# Altium footprint library IntLib.PcbLib: 221 footprints (part 2 of 14)
Each footprint in its own frame and in the unit in brackets; x right, y up, seen from the top. Pads: shape width x height; smd on the part's side, far side on the other; paste and mask are expansions set on the pad; w line width, h text height; cw(c..) or ccw(c..) is an arc to the next point about the centre after c.
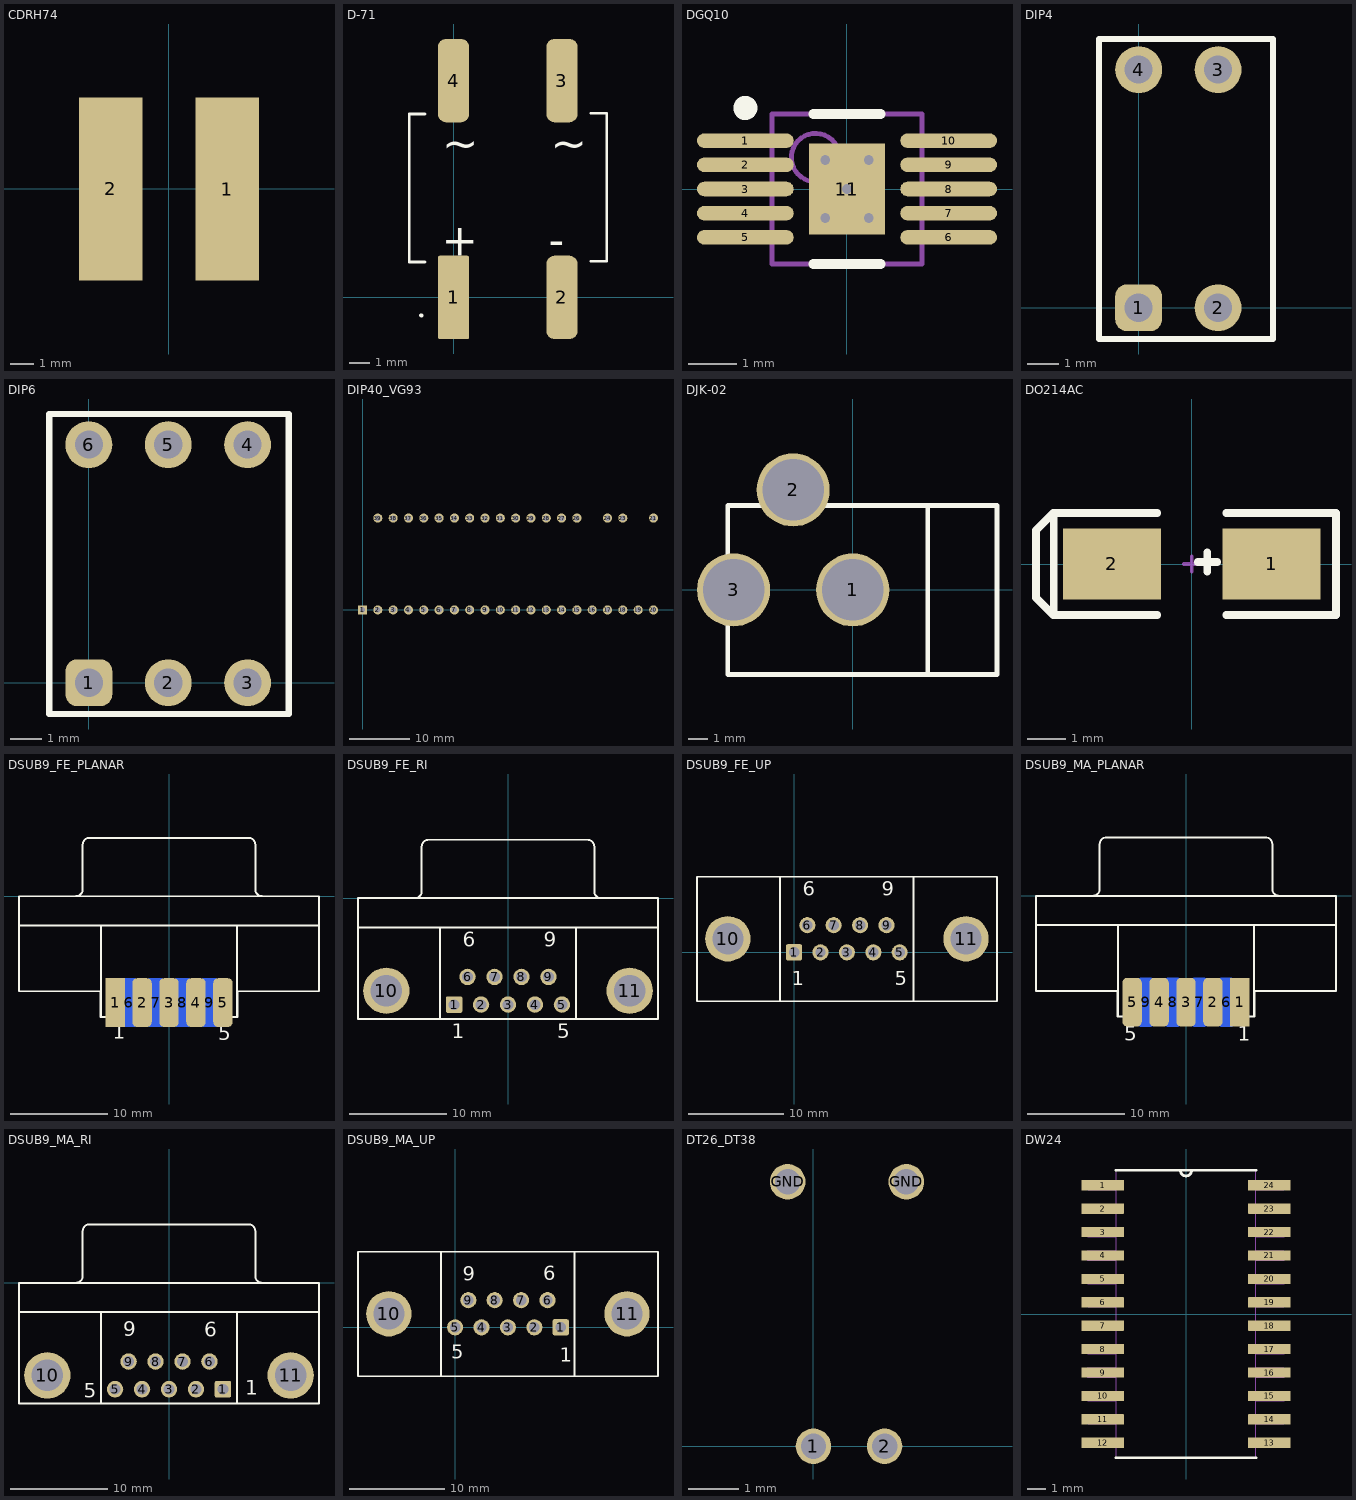
[diagram p1: the footprints below, top view; thin cyan lines are the x and y axes]

## CDRH74 [mm] "CDRH74 or SCB0704"
height 5
pads (2):
  rect 2.75x8 smd: 1(2.54,0) 2(-2.54,0)
3D body: height 4.5, standoff 0, extent -3.632,-3.556 3.668,3.744

## D-71 [mm] "D-71 / DB-1S Diode Bridge"
height 5
pads (4):
  rrect10% 1.5x4 smd: 1(0,0)
  rrect50% 1.5x4 smd: 2(5.207,0) 3(5.207,10.414) 4(0,10.414)
Top Overlay:
  circle w0.1: c-1.549,-0.864 r0.05
  lines w0.127: -1.372,1.702 -2.134,1.702 -2.134,8.814 -1.372,8.814 ; 6.604,1.727 7.366,1.727 7.366,8.839 6.604,8.839
  text "~" at -0.533,6.655 h1.52
  text "~" at 4.674,6.655 h1.52
  text "-" at 4.572,2.032 h1.52
  text "+" at -0.559,2.007 h1.52
3D body: height 3.65, standoff 0.08, extent -1.652,0.133 6.858,10.433

## DGQ10 [mm] "TSSOP, 10-Leads, Body 3x3mm, Pitch 0.5mm, Thermal Pad 1.88x1.57mm, IPC Low Density"
height 1.1
pads (11):
  oval 2x0.3 smd: 1(-2.1,1) 2(-2.1,0.5) 3(-2.1,0) 4(-2.1,-0.5) 5(-2.1,-1) 6(2.1,-1) 7(2.1,-0.5) 8(2.1,0) 9(2.1,0.5) 10(2.1,1)
  rect 1.57x1.88 smd: 11(0,0)
via -0.45,0.6 diameter 0.5 hole 0.2
via -0.45,-0.6 diameter 0.5 hole 0.2
via 0.45,-0.6 diameter 0.5 hole 0.2
via 0.45,0.6 diameter 0.5 hole 0.2
via 0,0 diameter 0.5 hole 0.2
Top Overlay:
  circle w0.25: c-2.1,1.675 r0.125
  lines w0.2: -0.7,-1.55 0.7,-1.55 ; -0.7,1.55 0.7,1.55
Mechanical 13:
  circle w0.1: c-0.65,0.65 r0.5
  lines w0.1: -1.55,-1.55 -1.55,1.55 1.55,1.55 1.55,-1.55 -1.55,-1.55
Mechanical 15:
  lines w0.1: -0.5,0 0.5,0 ; 0,-0.5 0,0.5
3D body: height 1.1, standoff 0, extent -2.518,-1.549 2.518,1.551

## DIP4 [mm] "DIP-4"
pads (4):
  rrect50% 1.5x1.5 hole 0.9: 1(0,0)
  round 1.5 hole 0.9: 2(2.54,0) 3(2.54,7.62) 4(0,7.62)
Top Overlay:
  lines w0.2: -1.27,-1 -1.27,8.6 4.3,8.6 4.3,-1 -1.27,-1
3D body: height 4.31, standoff -3.28, extent -1.44,-0.3 4.1,7.7

## DIP6 [mm] "DIP-6"
pads (6):
  rrect50% 1.5x1.5 hole 0.9: 1(0,0)
  round 1.5 hole 0.9: 2(2.54,0) 3(5.08,0) 4(5.08,7.62) 5(2.54,7.62) 6(0,7.62)
Top Overlay:
  lines w0.2: -1.27,-1 -1.27,8.6 6.4,8.6 6.4,-1 -1.27,-1
3D body: height 5.3, standoff -2, extent -1,-0.135 6.12,7.735

## DIP40_VG93 [mm] "DIP; 40 Leads; Row Spacing 15.24 mm; Pitch 2.54 mm"
height 4.96
pads (37):
  rect 1.5x1.5 hole 0.9: 1(0,0)
  round 1.5 hole 0.9: 2(2.54,0) 3(5.08,0) 4(7.62,0) 5(10.16,0) 6(12.7,0) 7(15.24,0) 8(17.78,0) 9(20.32,0) 10(22.86,0) 11(25.4,0) 12(27.94,0) 13(30.48,0) 14(33.02,0) 15(35.56,0) 16(38.1,0) 17(40.64,0) 18(43.18,0) 19(45.72,0) 20(48.26,0) 21(48.26,15.24) 23(43.18,15.24) 24(40.64,15.24) 26(35.56,15.24) 27(33.02,15.24) 28(30.48,15.24) 29(27.94,15.24) 30(25.4,15.24) 31(22.86,15.24) 32(20.32,15.24) 33(17.78,15.24) 34(15.24,15.24) 35(12.7,15.24) 36(10.16,15.24) 37(7.62,15.24) 38(5.08,15.24) 39(2.54,15.24)

## DJK-02 [mm]
pads (3):
  round 3.8 hole 3.2: 1(0,0) 2(-3.1,5.2) 3(-6.2,0)
Top Overlay:
  lines w0.254: 3.9,-4.4 3.9,4.4 ; -6.5,-4.4 7.5,-4.4 7.5,4.4 -6.5,4.4 -6.5,-4.4
3D body: height 11.2, standoff -3.3, extent -6.971,-4.497 7.529,4.953

## DO214AC [mm] "DO-214-AC/SMA; 2 C-Bend Leads; Body 5.3 x 2.6 mm, inc. leads (LxW)"
height 2.34
pads (2):
  rect 2.55x1.85 smd: 1(2.075,0) 2(-2.075,0)
Top Overlay:
  lines w0.2: -3.591,-1.325 -3.591,1.325 ; -0.9,-1.325 -3.6,-1.325 -4.05,-0.875 -4.05,0.875 -3.6,1.325 -0.9,1.325 ; 0.152,0.051 0.66,0.051 ; 0.406,-0.203 0.406,0.305 ; 0.9,-1.325 3.75,-1.325 3.75,1.325 0.9,1.325
Mechanical 3:
  lines w0.1: -0.2,0 0.2,0 ; 0,-0.2 0,0.2
3D body: height 2.6, standoff 0.03, extent -2.718,-1.397 2.782,1.403

## DSUB9_FE_PLANAR [mm] "Connector; D Subminiature; 9 Position; Right Angle; Pitch 1.385 mm"
height 12.75
pads (9):
  rect 2x5 smd: 1(-5.54,-10.92)
  rrect50% 2x5 smd: 2(-2.77,-10.92) 3(0,-10.92) 4(2.77,-10.92) 5(5.54,-10.92)
  rrect50% 2x5 smd far side: 6(-4.155,-10.92) 7(-1.385,-10.92) 8(1.385,-10.92) 9(4.155,-10.92)
Top Overlay:
  lines w0.2: -15.4,-3 15.4,-3 ; -9.56,0.005 ccw(c-9.56,0.7) -8.865,0.7 -8.865,5.3 ; -8.86,5.305 cw(c-8.165,5.305) -8.165,6 8.165,6 cw(c8.165,5.305) 8.86,5.305 ; -7,-12.4 -7,-3 ; 7,-12.4 7,-3 ; 8.865,5.3 8.865,0.7 ccw(c9.56,0.7) 9.56,0.005 ; -15.4,-9.754 -15.4,0 15.4,0 15.4,-9.754 7.01,-9.754 7.01,-12.4 -7.01,-12.4 -7.01,-9.754 -15.4,-9.754
  text "1" at -5.791,-14.63 h1.5
  text "5" at 5.055,-14.783 h1.5
Bottom Overlay:
  text "9" at 4.445,-14.757 h1.5
  text "6" at -3.556,-14.681 h1.5
3D body: height 5.77, standoff -6.77, extent -15.43,-9.754 15.38,5.896

## DSUB9_FE_RI [mm] "Connector; D Subminiature; 9 Position; Right Angle; Pitch 1.385 mm"
height 12.75
pads (11):
  rrect20% 1.69x1.69 hole 1.09: 1(-5.54,-10.92)
  round 1.69 hole 1.09: 2(-2.77,-10.92) 3(0,-10.92) 4(2.77,-10.92) 5(5.54,-10.92) 6(-4.155,-8.08) 7(-1.385,-8.08) 8(1.385,-8.08) 9(4.155,-8.08)
  round 4.76 hole 3.26: 10(-12.495,-9.5) 11(12.495,-9.5)
Top Overlay:
  lines w0.2: -15.4,-3 15.4,-3 ; -9.56,0.005 ccw(c-9.56,0.7) -8.865,0.7 -8.865,5.3 ; -8.86,5.305 cw(c-8.165,5.305) -8.165,6 8.165,6 cw(c8.165,5.305) 8.86,5.305 ; -7,-12.4 -7,-3 ; 7,-12.4 7,-3 ; 8.865,5.3 8.865,0.7 ccw(c9.56,0.7) 9.56,0.005 ; -15.4,-12.4 15.4,-12.4 15.4,0 -15.4,0 -15.4,-12.4
  text "6" at -4.655,-4.975 h1.5
  text "9" at 3.655,-4.975 h1.5
  text "5" at 5.04,-14.375 h1.5
  text "1" at -5.79,-14.375 h1.5
3D body: height 12.87, standoff -2.88, extent -15.392,-12.319 15.418,6.433

## DSUB9_FE_UP [mm] "Connector; D Subminiature; 9 Position; Right Angle; Pitch 1.385 mm"
height 12.75
pads (11):
  rrect20% 1.69x1.69 hole 1.09: 1(0,0)
  round 1.69 hole 1.09: 2(2.77,0) 3(5.54,0) 4(8.31,0) 5(11.08,0) 6(1.385,2.84) 7(4.155,2.84) 8(6.925,2.84) 9(9.695,2.84)
  round 4.76 hole 3.26: 10(-6.955,1.42) 11(18.035,1.42)
Top Overlay:
  lines w0.2: -1.46,-5.131 -1.46,7.92 ; 12.54,-5.131 12.54,7.92 ; -10.185,-5.131 -10.185,7.92 21.285,7.92 21.285,-5.131 -10.185,-5.131
  text "1" at -0.25,-3.455 h1.5
  text "5" at 10.58,-3.455 h1.5
  text "9" at 9.195,5.945 h1.5
  text "6" at 0.885,5.945 h1.5
3D body: height 13.15, standoff -3.8, extent -9.997,-4.854 20.803,7.696

## DSUB9_MA_PLANAR [mm] "Connector; D Subminiature; 9 Position; Right Angle; Pitch 1.385 mm"
height 12.75
pads (9):
  rect 2x5 smd: 1(5.54,-10.92)
  rrect50% 2x5 smd: 2(2.77,-10.92) 3(0,-10.92) 4(-2.77,-10.92) 5(-5.54,-10.92)
  rrect50% 2x5 smd far side: 6(4.155,-10.92) 7(1.385,-10.92) 8(-1.385,-10.92) 9(-4.155,-10.92)
Top Overlay:
  lines w0.2: -15.4,-3 15.4,-3 ; -9.56,0.005 ccw(c-9.56,0.7) -8.865,0.7 -8.865,5.3 ; -8.86,5.305 cw(c-8.165,5.305) -8.165,6 8.165,6 cw(c8.165,5.305) 8.86,5.305 ; -7,-12.4 -7,-3 ; 7,-12.4 7,-3 ; 8.865,5.3 8.865,0.7 ccw(c9.56,0.7) 9.56,0.005 ; -15.4,-9.754 -15.4,0 15.4,0 15.4,-9.754 7.01,-9.754 7.01,-12.4 -7.01,-12.4 -7.01,-9.754 -15.4,-9.754
  text "1" at 5.334,-14.859 h1.5
  text "5" at -6.35,-14.859 h1.5
Bottom Overlay:
  text "6" at 4.597,-14.91 h1.5
  text "9" at -3.734,-14.859 h1.5
3D body: height 5.77, standoff -6.77, extent -15.494,-9.728 15.325,6.18

## DSUB9_MA_RI [mm] "Connector; D Subminiature; 9 Position; Right Angle; Pitch 1.385 mm"
height 12.75
pads (11):
  rrect20% 1.69x1.69 hole 1.09: 1(5.54,-10.92)
  round 1.69 hole 1.09: 2(2.77,-10.92) 3(0,-10.92) 4(-2.77,-10.92) 5(-5.54,-10.92) 6(4.155,-8.08) 7(1.385,-8.08) 8(-1.385,-8.08) 9(-4.155,-8.08)
  round 4.76 hole 3.26: 10(-12.495,-9.5) 11(12.495,-9.5)
Top Overlay:
  lines w0.2: -15.4,-3 15.4,-3 ; -9.56,0.005 ccw(c-9.56,0.7) -8.865,0.7 -8.865,5.3 ; -8.86,5.305 cw(c-8.165,5.305) -8.165,6 8.165,6 cw(c8.165,5.305) 8.86,5.305 ; -7,-12.4 -7,-3 ; 7,-12.4 7,-3 ; 8.865,5.3 8.865,0.7 ccw(c9.56,0.7) 9.56,0.005 ; -15.4,-12.4 -15.4,0 15.4,0 15.4,-12.4 -15.4,-12.4
  text "1" at 7.823,-11.506 h1.5
  text "5" at -8.763,-11.811 h1.5
  text "9" at -4.699,-5.461 h1.5
  text "6" at 3.632,-5.512 h1.5
3D body: height 13.05, standoff -3.4, extent -15.342,-12.395 15.458,6.202

## DSUB9_MA_UP [mm] "Connector; D Subminiature; 9 Position; Right Angle; Pitch 1.385 mm"
height 12.75
pads (11):
  rrect20% 1.69x1.69 hole 1.09: 1(11.08,0)
  round 1.69 hole 1.09: 2(8.31,0) 3(5.54,0) 4(2.77,0) 5(0,0) 6(9.695,2.84) 7(6.925,2.84) 8(4.155,2.84) 9(1.385,2.84)
  round 4.76 hole 3.26: 10(-6.955,1.42) 11(18.035,1.42)
Top Overlay:
  lines w0.2: -1.46,-5.131 -1.46,7.92 ; 12.54,-5.131 12.54,7.92 ; -10.185,-5.131 21.285,-5.131 21.285,7.92 -10.185,7.92 -10.185,-5.131
  text "6" at 9.246,4.928 h1.5
  text "9" at 0.813,4.877 h1.5
  text "5" at -0.406,-3.302 h1.5
  text "1" at 10.973,-3.632 h1.5
3D body: height 13.15, standoff -3.8, extent -9.83,-4.928 20.97,7.622

## DT26_DT38 [mm]
pads (4):
  round 0.7 hole 0.5: 1(0,0) 2(1.4,0) GND(-0.508,5.207) GND(1.829,5.207)
3D body: height 2.1, standoff -1.9, extent -0.305,-0.152 1.695,6.988

## DW24 [mil]
pads (24):
  rrect10% 91x22 smd: 1(-178,275) 2(-178,225) 3(-178,175) 4(-178,125) 5(-178,75) 6(-178,25) 7(-178,-25) 8(-178,-75) 9(-178,-125) 10(-178,-175) 11(-178,-225) 12(-178,-275) 13(178,-275) 14(178,-225) 15(178,-175) 16(178,-125) 17(178,-75) 18(178,-25) 19(178,25) 20(178,75) 21(178,125) 22(178,175) 23(178,225) 24(178,275)
Top Overlay:
  lines w6: -149.5,-307 149.5,-307 ; -149.5,307 149.5,307 ; -12,307 ccw(c0,307) 12,307
Mechanical 1:
  lines w0: -12,307 ccw(c0,307) 12,307 ; -209.5,-285 -209.5,-265 -149.5,-265 -149.5,-285 -209.5,-285 ; -209.5,-235 -209.5,-215 -149.5,-215 -149.5,-235 -209.5,-235 ; -209.5,-185 -209.5,-165 -149.5,-165 -149.5,-185 -209.5,-185 ; -209.5,-135 -209.5,-115 -149.5,-115 -149.5,-135 -209.5,-135 ; -209.5,-85 -209.5,-65 -149.5,-65 -149.5,-85 -209.5,-85 ; -209.5,-35 -209.5,-15 -149.5,-15 -149.5,-35 -209.5,-35 ; -209.5,15 -209.5,35 -149.5,35 -149.5,15 -209.5,15 ; -209.5,65 -209.5,85 -149.5,85 -149.5,65 -209.5,65 ; -209.5,115 -209.5,135 -149.5,135 -149.5,115 -209.5,115 ; -209.5,165 -209.5,185 -149.5,185 -149.5,165 -209.5,165 ; -209.5,215 -209.5,235 -149.5,235 -149.5,215 -209.5,215 ; -209.5,265 -209.5,285 -149.5,285 -149.5,265 -209.5,265 ; -149.5,-307 149.5,-307 149.5,307 -149.5,307 -149.5,-307 ; 149.5,-285 149.5,-265 209.5,-265 209.5,-285 149.5,-285 ; 149.5,-235 149.5,-215 209.5,-215 209.5,-235 149.5,-235 ; 149.5,-185 149.5,-165 209.5,-165 209.5,-185 149.5,-185 ; 149.5,-135 149.5,-115 209.5,-115 209.5,-135 149.5,-135 ; 149.5,-85 149.5,-65 209.5,-65 209.5,-85 149.5,-85 ; 149.5,-35 149.5,-15 209.5,-15 209.5,-35 149.5,-35 ; 149.5,15 149.5,35 209.5,35 209.5,15 149.5,15 ; 149.5,65 149.5,85 209.5,85 209.5,65 149.5,65 ; 149.5,115 149.5,135 209.5,135 209.5,115 149.5,115 ; 149.5,165 149.5,185 209.5,185 209.5,165 149.5,165 ; 149.5,215 149.5,235 209.5,235 209.5,215 149.5,215 ; 149.5,265 149.5,285 209.5,285 209.5,265 149.5,265
3D body: height 96.12, standoff -0.8, extent -202.47,-301.99 202.47,302.01